# Altium footprint library UWRT_Footprint_Library_2020.PcbLib: 376 footprints (part 12 of 24)
Each footprint in its own frame and in the unit in brackets; x right, y up, seen from the top. Pads: shape width x height; smd on the part's side, far side on the other; paste and mask are expansions set on the pad; w line width, h text height; cw(c..) or ccw(c..) is an arc to the next point about the centre after c.
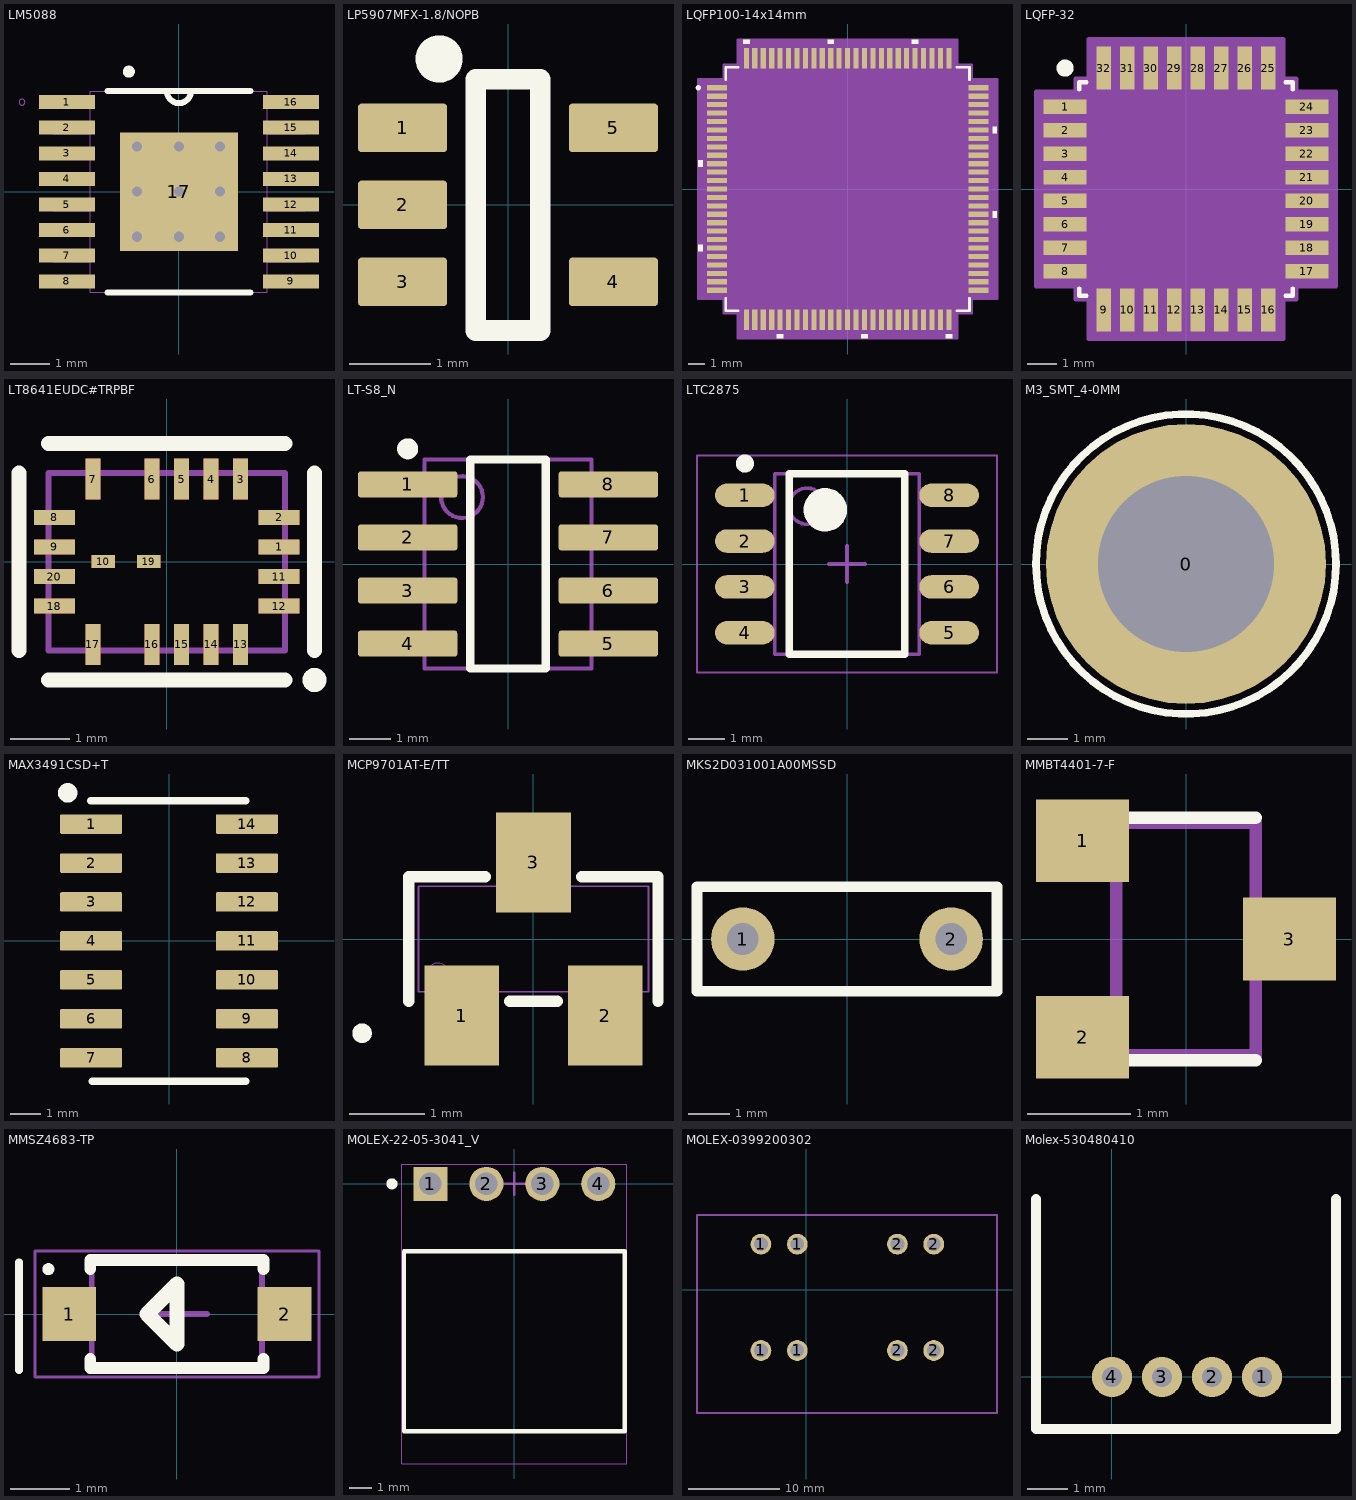
[diagram p11: the footprints below, top view; thin cyan lines are the x and y axes]

## LM5088 [mil]
pads (17):
  rect 56x14 smd paste-28: 1(-112,89.57) 2(-112,63.98) 3(-112,38.39) 4(-112,12.8) 5(-112,-12.8) 6(-112,-38.39) 7(-112,-63.98) 8(-112,-89.57) 9(112,-89.57) 10(112,-63.98) 11(112,-38.39) 12(112,-12.8) 13(112,12.8) 14(112,38.39) 15(112,63.98) 16(112,89.57)
  rect 118x118 smd paste-59: 17(0,0)
via 0,-45 diameter 20 hole 10
via 0,45 diameter 20 hole 10
via 0,0 diameter 20 hole 10
via -42,-45 diameter 20 hole 10
via -42,45 diameter 20 hole 10
via 41,-45 diameter 20 hole 10
via 41,45 diameter 20 hole 10
via -42,0 diameter 20 hole 10
via 41,0 diameter 20 hole 10
Top Overlay:
  circle w6: c-50,120 r3
  lines w6: -71.5,-100.5 71.5,-100.5 ; -71.5,100.5 71.5,100.5 ; -12,100.5 ccw(c0,100.5) 12,100.5
Mechanical 13:
  circle w0: c-156.8,89.57 r3
  lines w0: -12,100.5 ccw(c0,100.5) 12,100.5
  lines w1: -126,-95.57 -88.5,-95.57 -88.5,-83.57 -126,-83.57 -126,-95.57 ; -126,-69.98 -88.5,-69.98 -88.5,-57.98 -126,-57.98 -126,-69.98 ; -126,-44.39 -88.5,-44.39 -88.5,-32.39 -126,-32.39 -126,-44.39 ; -126,-18.8 -88.5,-18.8 -88.5,-6.8 -126,-6.8 -126,-18.8 ; -126,6.8 -88.5,6.8 -88.5,18.8 -126,18.8 -126,6.8 ; -126,32.39 -88.5,32.39 -88.5,44.39 -126,44.39 -126,32.39 ; -126,57.98 -88.5,57.98 -88.5,69.98 -126,69.98 -126,57.98 ; -126,83.57 -88.5,83.57 -88.5,95.57 -126,95.57 -126,83.57 ; -88.5,-100.5 -88.5,100.5 88.5,100.5 88.5,-100.5 -88.5,-100.5 ; 88.5,-95.57 126,-95.57 126,-83.57 88.5,-83.57 88.5,-95.57 ; 88.5,-69.98 126,-69.98 126,-57.98 88.5,-57.98 88.5,-69.98 ; 88.5,-44.39 126,-44.39 126,-32.39 88.5,-32.39 88.5,-44.39 ; 88.5,-18.8 126,-18.8 126,-6.8 88.5,-6.8 88.5,-18.8 ; 88.5,6.8 126,6.8 126,18.8 88.5,18.8 88.5,6.8 ; 88.5,32.39 126,32.39 126,44.39 88.5,44.39 88.5,32.39 ; 88.5,57.98 126,57.98 126,69.98 88.5,69.98 88.5,57.98 ; 88.5,83.57 126,83.57 126,95.57 88.5,95.57 88.5,83.57
3D body "MXA16A.step": height 43.11, standoff 0, extent -125.98,-100.51 125.98,100.51

## LP5907MFX-1.8/NOPB [mm]
height 1.45
pads (5):
  rrect15% 1.1x0.6 smd: 1(-1.3,0.95) 2(-1.3,0) 3(-1.3,-0.95) 4(1.3,-0.95) 5(1.3,0.95)
Top Overlay:
  circle w0.3: c-0.85,1.8 r0.141
  lines w0.254: -0.4,-1.55 -0.4,1.55 0.4,1.55 0.4,-1.55 -0.4,-1.55
3D body "SN74AHC1G02DBVT.stp": height 1.2, standoff 0, extent -1.4,-1.45 1.4,1.45

## LQFP100-14x14mm [mil]
pads (100):
  rect 47x12 smd paste+0 mask+0: 1(-305.12,236.22) 2(-305.12,216.54) 3(-305.12,196.85) 4(-305.12,177.17) 5(-305.12,157.48) 6(-305.12,137.8) 7(-305.12,118.11) 8(-305.12,98.43) 9(-305.12,78.74) 10(-305.12,59.06) 11(-305.12,39.37) 12(-305.12,19.69) 13(-305.12,0) 14(-305.12,-19.68) 15(-305.12,-39.37) 16(-305.12,-59.06) 17(-305.12,-78.74) 18(-305.12,-98.43) 19(-305.12,-118.11) 20(-305.12,-137.8) 21(-305.12,-157.48) 22(-305.12,-177.17) 23(-305.12,-196.85) 24(-305.12,-216.54) 25(-305.12,-236.22) 51(305.12,-236.22) 52(305.12,-216.54) 53(305.12,-196.85) 54(305.12,-177.17) 55(305.12,-157.48) 56(305.12,-137.8) 57(305.12,-118.11) 58(305.12,-98.43) 59(305.12,-78.74) 60(305.12,-59.06) 61(305.12,-39.37) 62(305.12,-19.68) 63(305.12,0) 64(305.12,19.68) 65(305.12,39.37) 66(305.12,59.06) 67(305.12,78.74) 68(305.12,98.43) 69(305.12,118.11) 70(305.12,137.8) 71(305.12,157.48) 72(305.12,177.17) 73(305.12,196.85) 74(305.12,216.54) 75(305.12,236.22)
  rect 12x47 smd paste+0 mask+0: 26(-236.22,-305.12) 27(-216.54,-305.12) 28(-196.85,-305.12) 29(-177.17,-305.12) 30(-157.48,-305.12) 31(-137.8,-305.12) 32(-118.11,-305.12) 33(-98.43,-305.12) 34(-78.74,-305.12) 35(-59.06,-305.12) 36(-39.37,-305.12) 37(-19.68,-305.12) 38(0,-305.12) 39(19.68,-305.12) 40(39.37,-305.12) 41(59.06,-305.12) 42(78.74,-305.12) 43(98.43,-305.12) 44(118.11,-305.12) 45(137.8,-305.12) 46(157.48,-305.12) 47(177.17,-305.12) 48(196.85,-305.12) 49(216.54,-305.12) 50(236.22,-305.12) 76(236.22,305.12) 77(216.54,305.12) 78(196.85,305.12) 79(177.17,305.12) 80(157.48,305.12) 81(137.8,305.12) 82(118.11,305.12) 83(98.43,305.12) 84(78.74,305.12) 85(59.06,305.12) 86(39.37,305.12) 87(19.68,305.12) 88(0,305.12) 89(-19.68,305.12) 90(-39.37,305.12) 91(-59.06,305.12) 92(-78.74,305.12) 93(-98.43,305.12) 94(-118.11,305.12) 95(-137.8,305.12) 96(-157.48,305.12) 97(-177.17,305.12) 98(-196.85,305.12) 99(-216.54,305.12) 100(-236.22,305.12)
Top Overlay:
  circle w6: c-348.46,236.22 r3
  region: -228.72,338.62 -243.72,338.62 -243.72,348.62 -228.72,348.62
  region: -31.87,338.62 -46.87,338.62 -46.87,348.62 -31.87,348.62
  region: 164.98,338.62 149.98,338.62 149.98,348.62 164.98,348.62
  region: 338.62,145.3 348.62,145.3 348.62,130.3 338.62,130.3
  region: 338.62,-51.56 348.62,-51.56 348.62,-66.56 338.62,-66.56
  region: 243.72,-338.62 228.72,-338.62 228.72,-348.62 243.72,-348.62
  region: 46.87,-338.62 31.87,-338.62 31.87,-348.62 46.87,-348.62
  region: -149.98,-338.62 -164.98,-338.62 -164.98,-348.62 -149.98,-348.62
  region: -338.62,-130.3 -348.62,-130.3 -348.62,-145.3 -338.62,-145.3
  region: -338.62,66.56 -348.62,66.56 -348.62,51.56 -338.62,51.56
  lines w6: -284.5,-255.32 -284.5,-284.5 -255.32,-284.5 ; -284.5,255.32 -284.5,284.5 -255.32,284.5 ; 255.32,-284.5 284.5,-284.5 284.5,-255.32 ; 255.32,284.5 284.5,284.5 284.5,255.32
Mechanical 13:
  circle w0: c-256.62,236.22 r3
  lines w1: -279.5,229.5 -229.5,279.5 ; -279.5,-279.5 -279.5,279.5 279.5,279.5 279.5,-279.5 -279.5,-279.5
Mechanical 15:
  region: -256.22,-289.5 -289.5,-289.5 -289.5,-256.22 -348.62,-256.22 -348.62,256.22 -289.5,256.22 -289.5,289.5 -256.22,289.5 -256.22,348.62 256.22,348.62 256.22,289.5 289.5,289.5 289.5,256.22 348.62,256.22 348.62,-256.22 289.5,-256.22 289.5,-289.5 256.22,-289.5 256.22,-348.62 -256.22,-348.62
  lines w6: -348.62,-256.22 -348.62,256.22 -289.5,256.22 -289.5,289.5 -256.22,289.5 -256.22,348.62 256.22,348.62 256.22,289.5 289.5,289.5 289.5,256.22 348.62,256.22 348.62,-256.22 289.5,-256.22 289.5,-289.5 256.22,-289.5 256.22,-348.62 -256.22,-348.62 -256.22,-289.5 -289.5,-289.5 -289.5,-256.22 -348.62,-256.22
3D body "LQFP100-14x14mm.step": height 63.11, standoff 0, extent -314.84,-314.84 314.84,314.84

## LQFP-32 [mil]
pads (32):
  rect 58x20 smd paste+0 mask+0: 1(-162,110.24) 2(-162,78.74) 3(-162,47.24) 4(-162,15.75) 5(-162,-15.75) 6(-162,-47.24) 7(-162,-78.74) 8(-162,-110.24) 17(162,-110.24) 18(162,-78.74) 19(162,-47.24) 20(162,-15.75) 21(162,15.75) 22(162,47.24) 23(162,78.74) 24(162,110.24)
  rect 20x58 smd paste+0 mask+0: 9(-110.24,-162) 10(-78.74,-162) 11(-47.24,-162) 12(-15.75,-162) 13(15.75,-162) 14(47.24,-162) 15(78.74,-162) 16(110.24,-162) 25(110.24,162) 26(78.74,162) 27(47.24,162) 28(15.75,162) 29(-15.75,162) 30(-47.24,162) 31(-78.74,162) 32(-110.24,162)
Top Overlay:
  circle w11.81: c-162,162 r5.57
  lines w6: -143,-133.34 -143,-143 -133.34,-143 ; -143,133.34 -143,143 -133.34,143 ; 133.34,-143 143,-143 143,-133.34 ; 133.34,143 143,143 143,133.34
Mechanical 13:
  lines w1: -138,88 -88,138 ; -177,-119.24 -177,-101.24 -138,-101.24 -138,-119.24 -177,-119.24 ; -177,-87.74 -177,-69.74 -138,-69.74 -138,-87.74 -177,-87.74 ; -177,-56.24 -177,-38.24 -138,-38.24 -138,-56.24 -177,-56.24 ; -177,-24.75 -177,-6.75 -138,-6.75 -138,-24.75 -177,-24.75 ; -177,6.75 -177,24.75 -138,24.75 -138,6.75 -177,6.75 ; -177,38.24 -177,56.24 -138,56.24 -138,38.24 -177,38.24 ; -177,69.74 -177,87.74 -138,87.74 -138,69.74 -177,69.74 ; -177,101.24 -177,119.24 -138,119.24 -138,101.24 -177,101.24 ; -138,-138 138,-138 138,138 -138,138 -138,-138 ; -119.24,-177 -119.24,-138 -101.24,-138 -101.24,-177 -119.24,-177 ; -119.24,138 -101.24,138 -101.24,177 -119.24,177 -119.24,138 ; -87.74,-177 -87.74,-138 -69.74,-138 -69.74,-177 -87.74,-177 ; -87.74,138 -69.74,138 -69.74,177 -87.74,177 -87.74,138 ; -56.24,-177 -56.24,-138 -38.24,-138 -38.24,-177 -56.24,-177 ; -56.24,138 -38.24,138 -38.24,177 -56.24,177 -56.24,138 ; -24.75,-177 -24.75,-138 -6.75,-138 -6.75,-177 -24.75,-177 ; -24.75,138 -6.75,138 -6.75,177 -24.75,177 -24.75,138 ; 6.75,-177 6.75,-138 24.75,-138 24.75,-177 6.75,-177 ; 6.75,138 24.75,138 24.75,177 6.75,177 6.75,138 ; 38.24,-177 38.24,-138 56.24,-138 56.24,-177 38.24,-177 ; 38.24,138 56.24,138 56.24,177 38.24,177 38.24,138 ; 69.74,-177 69.74,-138 87.74,-138 87.74,-177 69.74,-177 ; 69.74,138 87.74,138 87.74,177 69.74,177 69.74,138 ; 101.24,-177 101.24,-138 119.24,-138 119.24,-177 101.24,-177 ; 101.24,138 119.24,138 119.24,177 101.24,177 101.24,138 ; 138,-119.24 138,-101.24 177,-101.24 177,-119.24 138,-119.24 ; 138,-87.74 138,-69.74 177,-69.74 177,-87.74 138,-87.74 ; 138,-56.24 138,-38.24 177,-38.24 177,-56.24 138,-56.24 ; 138,-24.75 138,-6.75 177,-6.75 177,-24.75 138,-24.75 ; 138,6.75 138,24.75 177,24.75 177,6.75 138,6.75 ; 138,38.24 138,56.24 177,56.24 177,38.24 138,38.24 ; 138,69.74 138,87.74 177,87.74 177,69.74 138,69.74 ; 138,101.24 138,119.24 177,119.24 177,101.24 138,101.24
  text "*" at -135.5,100.98 h50
Mechanical 15:
  region: -130.24,-148 -148,-148 -148,-130.24 -201,-130.24 -201,130.24 -148,130.24 -148,148 -130.24,148 -130.24,201 130.24,201 130.24,148 148,148 148,130.24 201,130.24 201,-130.24 148,-130.24 148,-148 130.24,-148 130.24,-201 -130.24,-201
  lines w6: -201,-130.24 -148,-130.24 -148,-148 -130.24,-148 -130.24,-201 130.24,-201 130.24,-148 148,-148 148,-130.24 201,-130.24 201,130.24 148,130.24 148,148 130.24,148 130.24,201 -130.24,201 -130.24,148 -148,148 -148,130.24 -201,130.24 -201,-130.24
3D body "LQFP-32.step": height 63.11, standoff 0, extent -177.01,-177.01 177.01,177.01

## LT8641EUDC#TRPBF [mm] "Buck Converter"
height 5
pads (20):
  rect 0.7x0.25 smd: 1(1.9,0.25) 2(1.9,0.75) 8(-1.9,0.75) 9(-1.9,0.25) 11(1.9,-0.25) 12(1.9,-0.75) 18(-1.9,-0.75) 20(-1.9,-0.25)
  rect 0.25x0.7 smd: 3(1.25,1.4) 4(0.75,1.4) 5(0.25,1.4) 6(-0.25,1.4) 7(-1.25,1.4) 13(1.25,-1.4) 14(0.75,-1.4) 15(0.25,-1.4) 16(-0.25,-1.4) 17(-1.25,-1.4)
  rect 0.4x0.22 smd: 10(-1.075,0) 19(-0.305,0)
Top Layer:
  region: 1.55,0.875 1.55,0.625 2.25,0.625 2.25,0.875
  rectangle: -0.505,-0.11 -0.105,0.11
  rectangle: -1.275,-0.11 -0.875,0.11
  region: 1.55,0.375 1.55,0.125 2.25,0.125 2.25,0.375
  region: 1.55,-0.125 1.55,-0.375 2.25,-0.375 2.25,-0.125
  region: 1.55,-0.625 1.55,-0.875 2.25,-0.875 2.25,-0.625
  region: 1.375,-1.05 1.125,-1.05 1.125,-1.75 1.375,-1.75
  region: 0.875,-1.05 0.625,-1.05 0.625,-1.75 0.875,-1.75
  region: 0.375,-1.05 0.125,-1.05 0.125,-1.75 0.375,-1.75
  region: -0.125,-1.05 -0.375,-1.05 -0.375,-1.75 -0.125,-1.75
  region: -1.125,-1.05 -1.375,-1.05 -1.375,-1.75 -1.125,-1.75
  region: -1.55,-0.875 -1.55,-0.625 -2.25,-0.625 -2.25,-0.875
  region: -1.55,-0.375 -1.55,-0.125 -2.25,-0.125 -2.25,-0.375
  region: -1.55,0.125 -1.55,0.375 -2.25,0.375 -2.25,0.125
  region: -1.55,0.625 -1.55,0.875 -2.25,0.875 -2.25,0.625
  rectangle: -1.375,1.05 -1.125,1.75
  rectangle: 1.125,1.05 1.375,1.75
  rectangle: 0.625,1.05 0.875,1.75
  rectangle: 0.125,1.05 0.375,1.75
  rectangle: -0.375,1.05 -0.125,1.75
Top Overlay:
  circle w0.254: c2.5,-2 r0.076
  lines w0.25: -2.5,-1.5 -2.5,1.5 ; -2,-2 2,-2 ; -2,2 2,2 ; 2.5,-1.5 2.5,1.5
Top Paste:
  region: 1.55,-0.625 1.55,-0.875 2.25,-0.875 2.25,-0.625
  region: 1.55,-0.125 1.55,-0.375 2.25,-0.375 2.25,-0.125
  region: 1.55,0.375 1.55,0.125 2.25,0.125 2.25,0.375
  region: 1.375,1.75 1.125,1.75 1.125,1.05 1.375,1.05
  region: 0.875,1.75 0.625,1.75 0.625,1.05 0.875,1.05
  region: 0.375,1.75 0.125,1.75 0.125,1.05 0.375,1.05
  region: -0.125,1.75 -0.375,1.75 -0.375,1.05 -0.125,1.05
  region: -1.125,1.75 -1.375,1.75 -1.375,1.05 -1.125,1.05
  rectangle: -0.505,-0.11 -0.105,0.11
  rectangle: -1.275,-0.11 -0.875,0.11
  region: -1.125,-1.05 -1.375,-1.05 -1.375,-1.75 -1.125,-1.75
  region: -0.125,-1.05 -0.375,-1.05 -0.375,-1.75 -0.125,-1.75
  region: 0.375,-1.05 0.125,-1.05 0.125,-1.75 0.375,-1.75
  region: 0.875,-1.05 0.625,-1.05 0.625,-1.75 0.875,-1.75
  region: 1.375,-1.05 1.125,-1.05 1.125,-1.75 1.375,-1.75
  region: -1.55,-0.875 -1.55,-0.625 -2.25,-0.625 -2.25,-0.875
  region: -1.55,-0.375 -1.55,-0.125 -2.25,-0.125 -2.25,-0.375
  region: -1.55,0.125 -1.55,0.375 -2.25,0.375 -2.25,0.125
  region: -1.55,0.625 -1.55,0.875 -2.25,0.875 -2.25,0.625
Mechanical 13:
  lines w0.1: -2,-1.5 -2,1.5 2,1.5 2,-1.5 -2,-1.5

## LT-S8_N [mm] "SOP, 8-Leads, Body 4.9x3.9mm, Pitch 1.27mm, IPC Medium Density"
height 1.76
pads (8):
  rrect20% 2.375x0.625 smd: 1(-2.4,1.905) 2(-2.4,0.635) 3(-2.4,-0.635) 4(-2.4,-1.905) 5(2.4,-1.905) 6(2.4,-0.635) 7(2.4,0.635) 8(2.4,1.905)
Top Overlay:
  circle w0.25: c-2.4,2.755 r0.125
  lines w0.2: -0.9,-2.5 -0.9,2.5 0.9,2.5 0.9,-2.5 -0.9,-2.5
Mechanical 13:
  circle w0.1: c-1.1,1.6 r0.5
  lines w0.1: -2,-2.5 -2,2.5 2,2.5 2,-2.5 -2,-2.5
3D body "SO-8.step": height 1.45, standoff 0, extent -2.911,-2.4 2.867,2.502

## LTC2875 [mm] "SOIC, 8-Leads, Body 5x4mm, Pitch 1.27mm, IPC Low Density"
height 1.75
pads (8):
  oval 1.65x0.65 smd: 1(-2.825,1.905) 2(-2.825,0.635) 3(-2.825,-0.635) 4(-2.825,-1.905) 5(2.825,-1.905) 6(2.825,-0.635) 7(2.825,0.635) 8(2.825,1.905)
Top Overlay:
  circle w0.6: c-0.6,1.5 r0.3
  circle w0.25: c-2.825,2.78 r0.125
  lines w0.2: -1.6,-2.5 1.6,-2.5 1.6,2.5 -1.6,2.5 -1.6,-2.5
Mechanical 13:
  circle w0.1: c-1.1,1.6 r0.5
  lines w0.1: -2,-2.5 2,-2.5 2,2.5 -2,2.5 -2,-2.5
Mechanical 15:
  lines w0.05: -4.15,-3 4.15,-3 4.15,3 -4.15,3 -4.15,-3
  lines w0.1: -0.5,0 0.5,0 ; 0,-0.5 0,0.5
3D body "SOIC127P600X175-8M.step": height 1.75, standoff 0, extent -3,-2.5 3,2.5

## M3_SMT_4-0MM [mm]
pads (1):
  round 7 hole 4.4: 0(0,0)
Top Overlay:
  circle w0.19: c0,0 r3.75
Top Paste:
  lines w1.2: -2.678,-0.975 ccw(c0,0) -0.975,-2.678 ; -2.678,0.975 cw(c0,0) -0.975,2.678 ; 0.975,-2.678 ccw(c0,0) 2.678,-0.975 ; 0.975,2.678 cw(c0,0) 2.678,0.975
3D body "9774040360R (rev1).stp": height 4.01, standoff -1.39, extent -3,-3 3,3

## MAX3491CSD+T [mil] "RS-422/485 Transceiver footprint (14-SOIC)"
pads (14):
  rrect15% 80x25 smd: 1(-100,150) 2(-100,100) 3(-100,50) 4(-100,0) 5(-100,-50) 6(-100,-100) 7(-100,-150) 8(100,-150) 9(100,-100) 10(100,-50) 11(100,0) 12(100,50) 13(100,100) 14(100,150)
Top Overlay:
  lines w10: -98.5,-180 98.5,-180 ; -98.5,180 -100,180 98.5,180
  lines w15: -125,190.01 ccw(c-130,190) -125,189.99
3D body "User Library-so14-1.STEP": height 66.93, standoff 0, extent -119.61,-173.23 116.61,173.23

## MCP9701AT-E/TT [mil]
pads (3):
  rect 39x52 smd: 1(-37.4,-39.97) 2(37.4,-39.97) 3(0,39.97)
Top Overlay:
  lines w6: -65.04,-32.56 -65.04,32.56 -25.1,32.56 ; -12.3,-32.56 12.3,-32.56 ; 25.1,32.56 65.04,32.56 65.04,-32.56 ; -87.46,-49.21 ccw(c-89.57,-49.21) -87.46,-49.22
Mechanical 13:
  circle w0: c-50.04,-17.56 r5
  lines w1: -60.04,-27.56 60.04,-27.56 60.04,27.56 -60.04,27.56 -60.04,-27.56 ; -48.4,-51.97 -48.4,-27.56 -26.4,-27.56 -26.4,-51.97 -48.4,-51.97 ; -11,27.56 11,27.56 11,51.97 -11,51.97 -11,27.56 ; 26.4,-51.97 26.4,-27.56 48.4,-27.56 48.4,-51.97 26.4,-51.97
3D body: height 10, standoff 0, extent 0,0 10,10
3D body "SOT-23_MC.step": height 44.17, standoff 0, extent -60.03,-51.96 60.04,51.97

## MKS2D031001A00MSSD [mil]
pads (2):
  round 60 hole 30: 1(-98.43,0) 2(98.43,0)
Top Overlay:
  lines w10: -141.73,-49.21 141.73,-49.21 141.73,49.21 -141.73,49.21 -141.73,-49.21 ; -141.73,-49.21 -141.73,-49.21
3D body "User Library-MKS2B042201F00KF00.STEP": height 393.7, standoff -118.11, extent -141.73,-98.43 141.73,98.43

## MMBT4401-7-F [mm]
pads (3):
  rect 0.9x0.8 smd: 1(-1,0.95) 2(-1,-0.95) 3(1,0)
Top Overlay:
  lines w0.12: -0.675,-1.173 0.675,-1.173 ; -0.675,1.173 0.675,1.173
Mechanical 13:
  lines w0.12: -0.675,-1.125 -0.675,1.125 0.675,1.125 0.675,-1.125 -0.675,-1.125
3D body "MMBT4401-7-F.STEP": height 1.1, standoff 0, extent -1.2,-1.45 1.2,1.45

## MMSZ4683-TP [mm] "SODFL, 2-Leads, Body 1.80x3.90mm, IPC Medium Density"
height 1.1
pads (2):
  rect 0.9x0.9 smd: 1(-1.8,0) 2(1.8,0)
Top Overlay:
  circle w0.1: c-2.15,0.75 r0.05
  lines w0.127: -2.642,-0.936 -2.642,0.864
  lines w0.2: -1.45,-0.75 -1.45,-0.9 1.45,-0.9 1.45,-0.75 ; -1.45,0.75 -1.45,0.9 1.45,0.9 1.45,0.75
  lines w0.254: -0.5,0 0,-0.5 0,0.5 -0.5,0
Mechanical 13:
  lines w0.1: -1.425,-0.9 1.425,-0.9 1.425,0.9 -1.425,0.9 -1.425,-0.9
Mechanical 15:
  lines w0.05: -2.375,-1.05 2.375,-1.05 2.375,1.05 -2.375,1.05 -2.375,-1.05
  lines w0.1: -0.5,0 0.5,0 ; 0,-0.5 0,0.5
3D body "MMSZ4683-TP.step": height 1.1, standoff 0, extent -1.95,-0.9 1.95,0.9

## MOLEX-22-05-3041_V [mm] "CONN, 4-Leads, Body 10.01x8.18mm, Pitch 2.54mm"
height 6.5
pads (4):
  rect 1.55x1.55 hole 1.02: 1(-3.81,0)
  round 1.55 hole 1.02: 2(-1.27,0) 3(1.27,0) 4(3.81,0)
Top Overlay:
  circle w0.25: c-5.554,0 r0.125
  lines w0.2: -5.005,-11.23 5.005,-11.23 5.005,-3.05 -5.005,-3.05 -5.005,-11.23
Mechanical 15:
  lines w0.05: -5.105,-12.711 -5.105,0.9 5.105,0.9 5.105,-12.711 -5.105,-12.711
  lines w0.1: -0.5,0 0.5,0 ; 0,-0.5 0,0.5
3D body "022053041.stp": height 6.43, standoff -3.51, extent -5.004,-12.611 5.004,0.318

## MOLEX-0399200302 [mil] "CONN, 4-Leads, Body 10.01x8.18mm, Pitch 2.54mm"
height 255.91
pads (8):
  round 90 hole 60: 1(-196.85,-263.15) 1(-196.85,196.85) 1(-39.37,-263.15) 1(-39.37,196.85) 2(393.7,-263.15) 2(393.7,196.85) 2(551.18,-263.15) 2(551.18,196.85)
Mechanical 15:
  lines w10: -473.43,-533.46 824.8,-533.46 824.8,322.83 -473.43,322.83 -473.43,-533.46
3D body "399200302.stp": height 1480, standoff -150, extent -448,-512 802,300

## Molex-530480410 [mm]
pads (4):
  round 1 hole 0.5: 1(3.75,0) 2(2.5,0) 3(1.25,0) 4(0,0)
Top Overlay:
  lines w0.254: -1.9,4.45 -1.9,-1.3 5.6,-1.3 5.6,4.45
3D body "530480410.stp": height 3.51, standoff -2.29, extent -1.5,-1.05 5.25,4.45